# Altium footprint library DR-WiFi Servo.PcbLib: 44 footprints (part 1 of 3)
Each footprint in its own frame and in the unit in brackets; x right, y up, seen from the top. Pads: shape width x height; smd on the part's side, far side on the other; paste and mask are expansions set on the pad; w line width, h text height; cw(c..) or ccw(c..) is an arc to the next point about the centre after c.
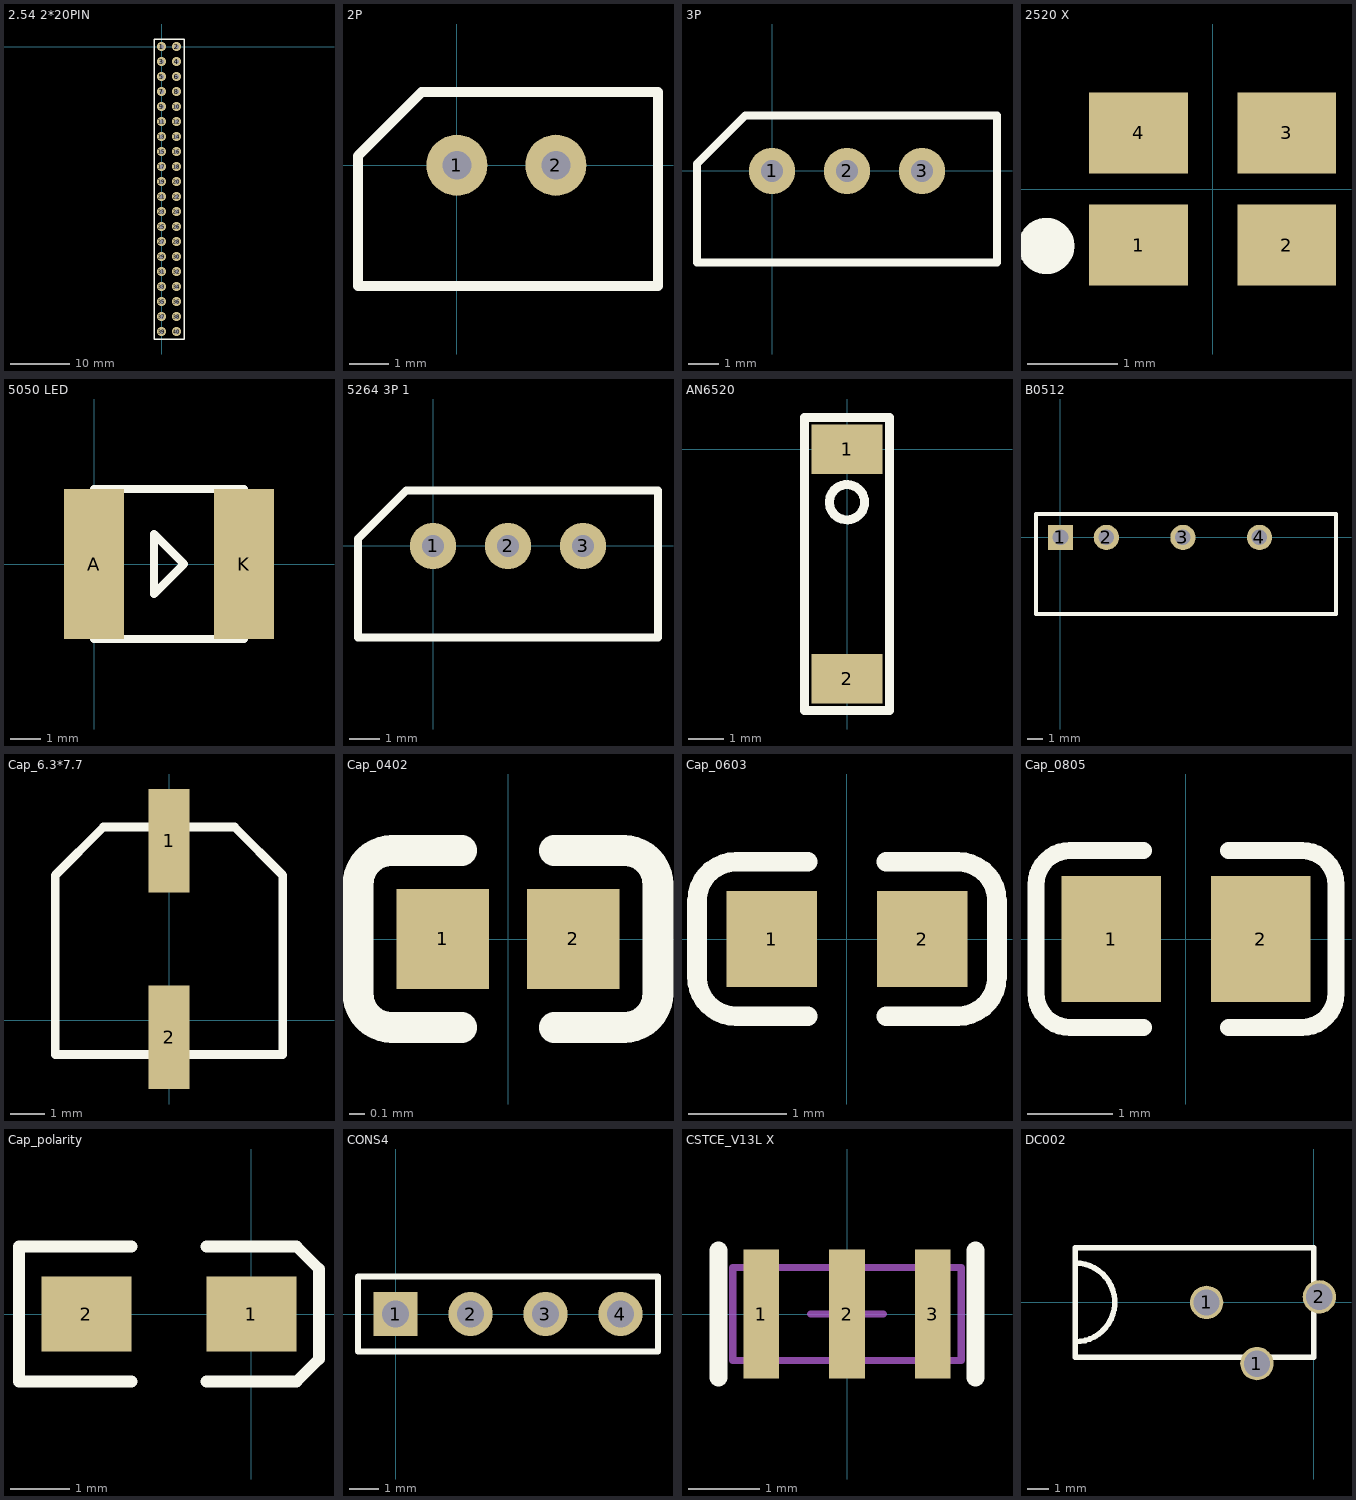
[diagram p0: the footprints below, top view; thin cyan lines are the x and y axes]

## 2.54 2*20PIN [mil]
pads (40):
  round 60 hole 30: 1(0,0) 2(100,0) 3(0,-100) 4(100,-100) 5(0,-200) 6(100,-200) 7(0,-300) 8(100,-300) 9(0,-400) 10(100,-400) 11(0,-500) 12(100,-500) 13(0,-600) 14(100,-600) 15(0,-700) 16(100,-700) 17(0,-800) 18(100,-800) 19(0,-900) 20(100,-900) 21(0,-1000) 22(100,-1000) 23(0,-1100) 24(100,-1100) 25(0,-1200) 26(100,-1200) 27(0,-1300) 28(100,-1300) 29(0,-1400) 30(100,-1400) 31(0,-1500) 32(100,-1500) 33(0,-1600) 34(100,-1600) 35(0,-1700) 36(100,-1700) 37(0,-1800) 38(100,-1800) 39(0,-1900) 40(100,-1900)
Top Overlay:
  lines w10: -50,-1950 -50,50 150,50 150,-1950 -50,-1950

## 2P [mm]
pads (2):
  round 1.542 hole 0.73: 1(0,0) 2(2.5,0)
Top Overlay:
  lines w0.254: -2.5,-3.05 -2.5,0.239 -0.889,1.85 5.08,1.85 5.08,-3.05 -2.5,-3.05
3D body: height 6, standoff -3.5, extent -2.531,-3.073 4.969,1.827

## 3P [mm]
pads (3):
  round 1.542 hole 0.73: 1(0,0) 2(2.5,0) 3(5,0)
Top Overlay:
  lines w0.254: -2.5,-3.05 7.5,-3.05 7.5,1.85 -0.889,1.85 -2.5,0.239 -2.5,-3.05
3D body: height 6, standoff -3.5, extent -2.511,-3.099 7.489,1.801

## 2520 X [mm]
height 0.45
pads (4):
  rect 1.1x0.9 smd: 1(-0.825,-0.625) 2(0.825,-0.625) 3(0.825,0.625) 4(-0.825,0.625)
Top Overlay:
  circle w0.4: c-1.854,-0.635 r0.114
3D body: height 0.45, standoff 0, extent -1.27,-1.016 1.27,1.016

## 5050 LED [mm]
pads (2):
  rect 2x5 smd: A(0,0) K(5,0)
Top Overlay:
  lines w0.254: 2,-1 3,0 ; 2,-1 2,-1 ; 2,-1 2,1 3,0 ; 3,0 3,0 ; 0,-2.5 0,0 0,2.5 5,2.5 5,-2.5 0,-2.5

## 5264 3P 1 [mm]
height 6.3
pads (3):
  round 1.542 hole 0.73: 1(0,0) 2(2.5,0) 3(5,0)
Top Overlay:
  lines w0.254: -2.5,-3.05 7.5,-3.05 7.5,1.85 -0.889,1.85 -2.5,0.239 -2.5,-3.05
3D body: height 6, standoff -3.5, extent -2.511,-3.099 7.489,1.801

## AN6520 [mm]
pads (2):
  rect 2x1.4 smd: 1(0,0) 2(0,-6.5)
Top Overlay:
  circle w0.254: c0,-1.5 r0.5
  lines w0.254: -1.2,-7.4 1.2,-7.4 1.2,0.9 -1.2,0.9 -1.2,-7.4
3D body: height 1, standoff 0, extent -1.1,-6.45 1.1,0.05

## B0512 [mil]
pads (4):
  rect 65x65 hole 40: 1(0,0)
  round 65 hole 40: 2(118,0) 3(314.96,0) 4(511.81,0)
Top Overlay:
  lines w10: -62.99,-196.85 -62.99,60 708.66,60 708.66,-196.85 -62.99,-196.85
3D body: height 393.7, standoff 0, extent -62.99,-196.85 708.66,59.06

## Cap_6.3*7.7 [mm]
pads (2):
  rect 1.2x3 smd: 1(0,5.2) 2(0,-0.5)
Top Overlay:
  lines w0.254: -0.6,-1 -3.3,-1 -3.3,2.3 -3.3,4.2 -1.9,5.6 -0.6,5.6 ; 0.6,-1 3.3,-1 3.3,2.3 3.3,4.2 1.9,5.6 0.6,5.6

## Cap_0402 [mm]
pads (2):
  rect 0.6x0.65 smd mask+0.051: 1(-0.425,0) 2(0.425,0)
Top Overlay:
  lines w0.2: -0.755,-0.575 cw(c-0.755,-0.355) -0.975,-0.355 -0.975,0.355 cw(c-0.755,0.355) -0.755,0.575 ; -0.75,-0.575 -0.3,-0.575 ; -0.75,0.575 -0.3,0.575 ; 0.3,-0.575 0.75,-0.575 ; 0.3,0.575 0.75,0.575 ; 0.755,-0.575 ccw(c0.755,-0.355) 0.975,-0.355 0.975,0.355 ccw(c0.755,0.355) 0.755,0.575
3D body: height 0.2, standoff 0, extent -0.483,-0.3 0.518,0.3

## Cap_0603 [mm]
pads (2):
  rect 0.93x0.98 smd: 1(-0.77,0) 2(0.77,0)
Top Overlay:
  lines w0.2: -0.4,-0.79 -1.135,-0.79 cw(c-1.135,-0.39) -1.535,-0.39 -1.535,0.39 cw(c-1.135,0.39) -1.135,0.79 -0.4,0.79 ; 0.4,-0.79 1.135,-0.79 ccw(c1.135,-0.39) 1.535,-0.39 1.535,0.39 ccw(c1.135,0.39) 1.135,0.79 0.4,0.79
3D body: height 0.3, standoff 0, extent -0.8,-0.4 0.8,0.4

## Cap_0805 [mm]
pads (2):
  rect 1.16x1.47 smd: 1(-0.875,0) 2(0.875,0)
Top Overlay:
  lines w0.2: -0.5,-1.035 -1.355,-1.035 cw(c-1.355,-0.635) -1.755,-0.635 -1.755,0.635 cw(c-1.355,0.635) -1.355,1.035 -0.5,1.035 ; 0.5,-1.035 1.355,-1.035 ccw(c1.355,-0.635) 1.755,-0.635 1.755,0.635 ccw(c1.355,0.635) 1.355,1.035 0.5,1.035
3D body: height 0.77, standoff -0.01, extent -0.999,-0.625 1.001,0.625

## Cap_polarity [mil]
pads (2):
  rect 60x50 smd: 1(0,0) 2(-110,0)
Top Overlay:
  lines w7.87: -80,-45 -155,-45 -155,45 -80,45 ; -30,-45 30,-45 45,-30 45,30 30,45 -30,45
3D body: height 63.86, standoff 0.86, extent -117.6,-31.5 7.36,31.49

## CONS4 [mm]
pads (4):
  rect 1.5x1.5 hole 0.9: 1(0,0)
  round 1.5 hole 0.9: 2(2.54,0) 3(5.08,0) 4(7.62,0)
Top Overlay:
  lines w0.2: -1.27,-1.27 8.89,-1.27 8.89,1.27 -1.27,1.27 -1.27,-1.27
3D body: height 10.1, standoff -1.5, extent -1.295,-1.27 8.865,1.27

## CSTCE_V13L X [mm]
height 2.62
pads (3):
  rect 0.5x1.8 smd: 1(-1.2,0) 2(0,0) 3(1.2,0)
Top Overlay:
  lines w0.254: -1.8,-0.889 -1.8,0.889 ; 1.8,-0.889 1.8,0.889
Mechanical 13:
  lines w0.1: -1.6,-0.65 -1.6,0.65 1.6,0.65 1.6,-0.65 -1.6,-0.65
Mechanical 15:
  lines w0.1: -0.508,0 0.508,0 ; 0,-0.508 0,0.508
3D body: height 1.02, standoff -0.09, extent -1.6,-0.64 1.6,0.66

## DC002 [mil]
pads (3):
  round 60 hole 47.24: 1(-192.91,0) 1(-102.36,-110.24) 2(10,10)
Top Overlay:
  lines w10: -429.13,-70.87 ccw(c-429.13,0) -429.13,70.87 ; -429.13,-98.43 -429.13,98.43 0,98.43 0,0 0,-98.43 -429.13,-98.43
3D body: height 291.34, standoff -118.11, extent -432.44,-114.41 12.44,110